# Altium schematic symbol library jlcpcb_2025_04_capacitors_extended_0805.schlib: 3281 symbols (part 17 of 18) (continued)
## TCC0805COG181J101BT
designator C?  Capacitance: 180pF  (hidden comment: *)
Capacitor, Ceramic (MLCC), 180pF, ±5%, 100V, null, ±5%, SMD 0805; Manufacturer: CCTC; Manufacturer Part Number: TCC0805COG181J101BT; Package Size: 0805; JLCPCB Basic Part: No; JLCPCB Part Number: C7393915; Supplier 1: LCSC; Category: Capacitors - MLCC; Supplier Part Number 1: C7393915; Tolerance: ±5%; Voltage Rating: 100V; Temperature Coefficient: null; RoHS: Yes; ComponentLink1Description: Datasheet; ComponentLink1URL: https://wmsc.lcsc.com/wmsc/upload/file/pdf/v2/lcsc/2306211554_CCTC-TCC0805COG181J101BT_C7393915.pdf; ComponentLink2Description: JLCPCB Part URL; ComponentLink2URL: https://jlcpcb.com/partdetail/C7393915; ComponentLink3Description: LCSC Part URL; ComponentLink3URL: https://lcsc.com/product-detail/Multilayer-Ceramic-Capacitors-MLCC---SMD-SMT_CCTC-CCTC-TCC0805COG181J101BT_C7393915.html
footprint CAP-0805 (0805 (2012M) Capacitor)
pins: 1, 2

## TCC0805COG181J500BT
designator C?  Capacitance: 180pF  (hidden comment: *)
Capacitor, Ceramic (MLCC), 180pF, ±5%, 50V, C0G, ±5%, SMD 0805; Manufacturer: CCTC; Manufacturer Part Number: TCC0805COG181J500BT; Package Size: 0805; JLCPCB Basic Part: No; JLCPCB Part Number: C376868; Supplier 1: LCSC; Category: Capacitors - MLCC; Supplier Part Number 1: C376868; Tolerance: ±5%; Voltage Rating: 50V; Temperature Coefficient: C0G; RoHS: Yes; ComponentLink1Description: Datasheet; ComponentLink1URL: https://wmsc.lcsc.com/wmsc/upload/file/pdf/v2/lcsc/2304140030_CCTC-TCC0805COG181J500BT_C376868.pdf; ComponentLink2Description: JLCPCB Part URL; ComponentLink2URL: https://jlcpcb.com/partdetail/C376868; ComponentLink3Description: LCSC Part URL; ComponentLink3URL: https://lcsc.com/product-detail/Multilayer-Ceramic-Capacitors-MLCC---SMD-SMT_CCTC-CCTC-TCC0805COG181J500BT_C376868.html
footprint CAP-0805 (0805 (2012M) Capacitor)
pins: 1, 2

## TCC0805COG200J101BT
designator C?  Capacitance: 20pF  (hidden comment: *)
Capacitor, Ceramic (MLCC), 20pF, ±5%, 100V, C0G, ±5%, SMD 0805; Manufacturer: CCTC; Manufacturer Part Number: TCC0805COG200J101BT; Package Size: 0805; JLCPCB Basic Part: No; JLCPCB Part Number: C696908; Supplier 1: LCSC; Category: Capacitors - MLCC; Supplier Part Number 1: C696908; Tolerance: ±5%; Voltage Rating: 100V; Temperature Coefficient: C0G; RoHS: Yes; ComponentLink1Description: Datasheet; ComponentLink1URL: https://wmsc.lcsc.com/wmsc/upload/file/pdf/v2/lcsc/2304140030_CCTC-TCC0805COG200J101BT_C696908.pdf; ComponentLink2Description: JLCPCB Part URL; ComponentLink2URL: https://jlcpcb.com/partdetail/C696908; ComponentLink3Description: LCSC Part URL; ComponentLink3URL: https://lcsc.com/product-detail/Multilayer-Ceramic-Capacitors-MLCC---SMD-SMT_CCTC-CCTC-TCC0805COG200J101BT_C696908.html
footprint CAP-0805 (0805 (2012M) Capacitor)
pins: 1, 2

## TCC0805COG200J500BT
designator C?  Capacitance: 20pF  (hidden comment: *)
Capacitor, Ceramic (MLCC), 20pF, ±5%, 50V, C0G, ±5%, SMD 0805; Manufacturer: CCTC; Manufacturer Part Number: TCC0805COG200J500BT; Package Size: 0805; JLCPCB Basic Part: No; JLCPCB Part Number: C309037; Supplier 1: LCSC; Category: Capacitors - MLCC; Supplier Part Number 1: C309037; Tolerance: ±5%; Voltage Rating: 50V; Temperature Coefficient: C0G; RoHS: Yes; ComponentLink1Description: Datasheet; ComponentLink1URL: https://wmsc.lcsc.com/wmsc/upload/file/pdf/v2/lcsc/2304140030_CCTC-TCC0805COG200J500BT_C309037.pdf; ComponentLink2Description: JLCPCB Part URL; ComponentLink2URL: https://jlcpcb.com/partdetail/C309037; ComponentLink3Description: LCSC Part URL; ComponentLink3URL: https://lcsc.com/product-detail/Multilayer-Ceramic-Capacitors-MLCC---SMD-SMT_CCTC-CCTC-TCC0805COG200J500BT_C309037.html
footprint CAP-0805 (0805 (2012M) Capacitor)
pins: 1, 2

## TCC0805COG200K500BT
designator C?  Capacitance: 20pF  (hidden comment: *)
Capacitor, Ceramic (MLCC), 20pF, ±10%, null, null, ±10%, SMD 0805; Manufacturer: CCTC; Manufacturer Part Number: TCC0805COG200K500BT; Package Size: 0805; JLCPCB Basic Part: No; JLCPCB Part Number: C5375851; Supplier 1: LCSC; Category: Capacitors - MLCC; Supplier Part Number 1: C5375851; Tolerance: ±10%; Voltage Rating: null; Temperature Coefficient: null; RoHS: Yes; ComponentLink1Description: Datasheet; ComponentLink2Description: JLCPCB Part URL; ComponentLink2URL: https://jlcpcb.com/partdetail/C5375851; ComponentLink3Description: LCSC Part URL; ComponentLink3URL: https://lcsc.com/product-detail/Multilayer-Ceramic-Capacitors-MLCC---SMD-SMT_CCTC-CCTC-TCC0805COG200K500BT_C5375851.html
footprint CAP-0805 (0805 (2012M) Capacitor)
pins: 1, 2

## TCC0805COG201J251BT
designator C?  Capacitance: 200pF  (hidden comment: *)
Capacitor, Ceramic (MLCC), 200pF, ±5%, 250V, null, ±5%, SMD 0805; Manufacturer: CCTC; Manufacturer Part Number: TCC0805COG201J251BT; Package Size: 0805; JLCPCB Basic Part: No; JLCPCB Part Number: C7393917; Supplier 1: LCSC; Category: Capacitors - MLCC; Supplier Part Number 1: C7393917; Tolerance: ±5%; Voltage Rating: 250V; Temperature Coefficient: null; RoHS: Yes; ComponentLink1Description: Datasheet; ComponentLink1URL: https://wmsc.lcsc.com/wmsc/upload/file/pdf/v2/lcsc/2306211554_CCTC-TCC0805COG201J251BT_C7393917.pdf; ComponentLink2Description: JLCPCB Part URL; ComponentLink2URL: https://jlcpcb.com/partdetail/C7393917; ComponentLink3Description: LCSC Part URL; ComponentLink3URL: https://lcsc.com/product-detail/Multilayer-Ceramic-Capacitors-MLCC---SMD-SMT_CCTC-CCTC-TCC0805COG201J251BT_C7393917.html
footprint CAP-0805 (0805 (2012M) Capacitor)
pins: 1, 2

## TCC0805COG201J500BT
designator C?  Capacitance: 200pF  (hidden comment: *)
Capacitor, Ceramic (MLCC), 200pF, ±5%, 50V, C0G, ±5%, SMD 0805; Manufacturer: CCTC; Manufacturer Part Number: TCC0805COG201J500BT; Package Size: 0805; JLCPCB Basic Part: No; JLCPCB Part Number: C376871; Supplier 1: LCSC; Category: Capacitors - MLCC; Supplier Part Number 1: C376871; Tolerance: ±5%; Voltage Rating: 50V; Temperature Coefficient: C0G; RoHS: Yes; ComponentLink1Description: Datasheet; ComponentLink1URL: https://wmsc.lcsc.com/wmsc/upload/file/pdf/v2/lcsc/2304140030_CCTC-TCC0805COG201J500BT_C376871.pdf; ComponentLink2Description: JLCPCB Part URL; ComponentLink2URL: https://jlcpcb.com/partdetail/C376871; ComponentLink3Description: LCSC Part URL; ComponentLink3URL: https://lcsc.com/product-detail/Multilayer-Ceramic-Capacitors-MLCC---SMD-SMT_CCTC-CCTC-TCC0805COG201J500BT_C376871.html
footprint CAP-0805 (0805 (2012M) Capacitor)
pins: 1, 2

## TCC0805COG220J101BT
designator C?  Capacitance: 22pF  (hidden comment: *)
Capacitor, Ceramic (MLCC), 22pF, ±5%, 100V, C0G, ±5%, SMD 0805; Manufacturer: CCTC; Manufacturer Part Number: TCC0805COG220J101BT; Package Size: 0805; JLCPCB Basic Part: No; JLCPCB Part Number: C376872; Supplier 1: LCSC; Category: Capacitors - MLCC; Supplier Part Number 1: C376872; Tolerance: ±5%; Voltage Rating: 100V; Temperature Coefficient: C0G; RoHS: Yes; ComponentLink1Description: Datasheet; ComponentLink1URL: https://wmsc.lcsc.com/wmsc/upload/file/pdf/v2/lcsc/2304140030_CCTC-TCC0805COG220J101BT_C376872.pdf; ComponentLink2Description: JLCPCB Part URL; ComponentLink2URL: https://jlcpcb.com/partdetail/C376872; ComponentLink3Description: LCSC Part URL; ComponentLink3URL: https://lcsc.com/product-detail/Multilayer-Ceramic-Capacitors-MLCC---SMD-SMT_CCTC-CCTC-TCC0805COG220J101BT_C376872.html
footprint CAP-0805 (0805 (2012M) Capacitor)
pins: 1, 2

## TCC0805COG220J251BT
designator C?  Capacitance: 22pF  (hidden comment: *)
Capacitor, Ceramic (MLCC), 22pF, ±5%, 250V, C0G, ±5%, SMD 0805; Manufacturer: CCTC; Manufacturer Part Number: TCC0805COG220J251BT; Package Size: 0805; JLCPCB Basic Part: No; JLCPCB Part Number: C696909; Supplier 1: LCSC; Category: Capacitors - MLCC; Supplier Part Number 1: C696909; Tolerance: ±5%; Voltage Rating: 250V; Temperature Coefficient: C0G; RoHS: Yes; ComponentLink1Description: Datasheet; ComponentLink1URL: https://wmsc.lcsc.com/wmsc/upload/file/pdf/v2/lcsc/2304140030_CCTC-TCC0805COG220J251BT_C696909.pdf; ComponentLink2Description: JLCPCB Part URL; ComponentLink2URL: https://jlcpcb.com/partdetail/C696909; ComponentLink3Description: LCSC Part URL; ComponentLink3URL: https://lcsc.com/product-detail/Multilayer-Ceramic-Capacitors-MLCC---SMD-SMT_CCTC-CCTC-TCC0805COG220J251BT_C696909.html
footprint CAP-0805 (0805 (2012M) Capacitor)
pins: 1, 2

## TCC0805COG220J500BT
designator C?  Capacitance: 22pF  (hidden comment: *)
Capacitor, Ceramic (MLCC), 22pF, ±5%, 50V, C0G, ±5%, SMD 0805; Manufacturer: CCTC; Manufacturer Part Number: TCC0805COG220J500BT; Package Size: 0805; JLCPCB Basic Part: No; JLCPCB Part Number: C376875; Supplier 1: LCSC; Category: Capacitors - MLCC; Supplier Part Number 1: C376875; Tolerance: ±5%; Voltage Rating: 50V; Temperature Coefficient: C0G; RoHS: Yes; ComponentLink1Description: Datasheet; ComponentLink1URL: https://wmsc.lcsc.com/wmsc/upload/file/pdf/v2/lcsc/2304140030_CCTC-TCC0805COG220J500BT_C376875.pdf; ComponentLink2Description: JLCPCB Part URL; ComponentLink2URL: https://jlcpcb.com/partdetail/C376875; ComponentLink3Description: LCSC Part URL; ComponentLink3URL: https://lcsc.com/product-detail/Multilayer-Ceramic-Capacitors-MLCC---SMD-SMT_CCTC-CCTC-TCC0805COG220J500BT_C376875.html
footprint CAP-0805 (0805 (2012M) Capacitor)
pins: 1, 2

## TCC0805COG221J500BT
designator C?  Capacitance: 220pF  (hidden comment: *)
Capacitor, Ceramic (MLCC), 220pF, ±5%, 50V, C0G, ±5%, SMD 0805; Manufacturer: CCTC; Manufacturer Part Number: TCC0805COG221J500BT; Package Size: 0805; JLCPCB Basic Part: No; JLCPCB Part Number: C309035; Supplier 1: LCSC; Category: Capacitors - MLCC; Supplier Part Number 1: C309035; Tolerance: ±5%; Voltage Rating: 50V; Temperature Coefficient: C0G; RoHS: Yes; ComponentLink1Description: Datasheet; ComponentLink1URL: https://wmsc.lcsc.com/wmsc/upload/file/pdf/v2/lcsc/2304140030_CCTC-TCC0805COG221J500BT_C309035.pdf; ComponentLink2Description: JLCPCB Part URL; ComponentLink2URL: https://jlcpcb.com/partdetail/C309035; ComponentLink3Description: LCSC Part URL; ComponentLink3URL: https://lcsc.com/product-detail/Multilayer-Ceramic-Capacitors-MLCC---SMD-SMT_CCTC-CCTC-TCC0805COG221J500BT_C309035.html
footprint CAP-0805 (0805 (2012M) Capacitor)
pins: 1, 2

## TCC0805COG222J500BT
designator C?  Capacitance: 2.2nF  (hidden comment: *)
Capacitor, Ceramic (MLCC), 2.2nF, ±5%, 50V, C0G, ±5%, SMD 0805; Manufacturer: CCTC; Manufacturer Part Number: TCC0805COG222J500BT; Package Size: 0805; JLCPCB Basic Part: No; JLCPCB Part Number: C380330; Supplier 1: LCSC; Category: Capacitors - MLCC; Supplier Part Number 1: C380330; Tolerance: ±5%; Voltage Rating: 50V; Temperature Coefficient: C0G; RoHS: Yes; ComponentLink1Description: Datasheet; ComponentLink1URL: https://wmsc.lcsc.com/wmsc/upload/file/pdf/v2/lcsc/2304140030_CCTC-TCC0805COG222J500BT_C380330.pdf; ComponentLink2Description: JLCPCB Part URL; ComponentLink2URL: https://jlcpcb.com/partdetail/C380330; ComponentLink3Description: LCSC Part URL; ComponentLink3URL: https://lcsc.com/product-detail/Multilayer-Ceramic-Capacitors-MLCC---SMD-SMT_CCTC-CCTC-TCC0805COG222J500BT_C380330.html
footprint CAP-0805 (0805 (2012M) Capacitor)
pins: 1, 2

## TCC0805COG240J500BT
designator C?  Capacitance: 24pF  (hidden comment: *)
Capacitor, Ceramic (MLCC), 24pF, ±5%, 50V, C0G, ±5%, SMD 0805; Manufacturer: CCTC; Manufacturer Part Number: TCC0805COG240J500BT; Package Size: 0805; JLCPCB Basic Part: No; JLCPCB Part Number: C376877; Supplier 1: LCSC; Category: Capacitors - MLCC; Supplier Part Number 1: C376877; Tolerance: ±5%; Voltage Rating: 50V; Temperature Coefficient: C0G; RoHS: Yes; ComponentLink1Description: Datasheet; ComponentLink1URL: https://wmsc.lcsc.com/wmsc/upload/file/pdf/v2/lcsc/2304140030_CCTC-TCC0805COG240J500BT_C376877.pdf; ComponentLink2Description: JLCPCB Part URL; ComponentLink2URL: https://jlcpcb.com/partdetail/C376877; ComponentLink3Description: LCSC Part URL; ComponentLink3URL: https://lcsc.com/product-detail/Multilayer-Ceramic-Capacitors-MLCC---SMD-SMT_CCTC-CCTC-TCC0805COG240J500BT_C376877.html
footprint CAP-0805 (0805 (2012M) Capacitor)
pins: 1, 2

## TCC0805COG250J500BT
designator C?  Capacitance: 25pF  (hidden comment: *)
Capacitor, Ceramic (MLCC), 25pF, ±5%, 50V, C0G, ±5%, SMD 0805; Manufacturer: CCTC; Manufacturer Part Number: TCC0805COG250J500BT; Package Size: 0805; JLCPCB Basic Part: No; JLCPCB Part Number: C376878; Supplier 1: LCSC; Category: Capacitors - MLCC; Supplier Part Number 1: C376878; Tolerance: ±5%; Voltage Rating: 50V; Temperature Coefficient: C0G; RoHS: Yes; ComponentLink1Description: Datasheet; ComponentLink1URL: https://wmsc.lcsc.com/wmsc/upload/file/pdf/v2/lcsc/2304140030_CCTC-TCC0805COG250J500BT_C376878.pdf; ComponentLink2Description: JLCPCB Part URL; ComponentLink2URL: https://jlcpcb.com/partdetail/C376878; ComponentLink3Description: LCSC Part URL; ComponentLink3URL: https://lcsc.com/product-detail/Multilayer-Ceramic-Capacitors-MLCC---SMD-SMT_CCTC-CCTC-TCC0805COG250J500BT_C376878.html
footprint CAP-0805 (0805 (2012M) Capacitor)
pins: 1, 2

## TCC0805COG270J500BT
designator C?  Capacitance: 27pF  (hidden comment: *)
Capacitor, Ceramic (MLCC), 27pF, ±5%, 50V, C0G, ±5%, SMD 0805; Manufacturer: CCTC; Manufacturer Part Number: TCC0805COG270J500BT; Package Size: 0805; JLCPCB Basic Part: No; JLCPCB Part Number: C282694; Supplier 1: LCSC; Category: Capacitors - MLCC; Supplier Part Number 1: C282694; Tolerance: ±5%; Voltage Rating: 50V; Temperature Coefficient: C0G; RoHS: Yes; ComponentLink1Description: Datasheet; ComponentLink1URL: https://wmsc.lcsc.com/wmsc/upload/file/pdf/v2/lcsc/2304140030_CCTC-TCC0805COG270J500BT_C282694.pdf; ComponentLink2Description: JLCPCB Part URL; ComponentLink2URL: https://jlcpcb.com/partdetail/C282694; ComponentLink3Description: LCSC Part URL; ComponentLink3URL: https://lcsc.com/product-detail/Multilayer-Ceramic-Capacitors-MLCC---SMD-SMT_CCTC-CCTC-TCC0805COG270J500BT_C282694.html
footprint CAP-0805 (0805 (2012M) Capacitor)
pins: 1, 2

## TCC0805COG300J500BT
designator C?  Capacitance: 30pF  (hidden comment: *)
Capacitor, Ceramic (MLCC), 30pF, ±5%, 50V, C0G, ±5%, SMD 0805; Manufacturer: CCTC; Manufacturer Part Number: TCC0805COG300J500BT; Package Size: 0805; JLCPCB Basic Part: No; JLCPCB Part Number: C376880; Supplier 1: LCSC; Category: Capacitors - MLCC; Supplier Part Number 1: C376880; Tolerance: ±5%; Voltage Rating: 50V; Temperature Coefficient: C0G; RoHS: Yes; ComponentLink1Description: Datasheet; ComponentLink1URL: https://wmsc.lcsc.com/wmsc/upload/file/pdf/v2/lcsc/2304140030_CCTC-TCC0805COG300J500BT_C376880.pdf; ComponentLink2Description: JLCPCB Part URL; ComponentLink2URL: https://jlcpcb.com/partdetail/C376880; ComponentLink3Description: LCSC Part URL; ComponentLink3URL: https://lcsc.com/product-detail/Multilayer-Ceramic-Capacitors-MLCC---SMD-SMT_CCTC-CCTC-TCC0805COG300J500BT_C376880.html
footprint CAP-0805 (0805 (2012M) Capacitor)
pins: 1, 2

## TCC0805COG301J500BT
designator C?  Capacitance: 300pF  (hidden comment: *)
Capacitor, Ceramic (MLCC), 300pF, ±5%, 50V, C0G, ±5%, SMD 0805; Manufacturer: CCTC; Manufacturer Part Number: TCC0805COG301J500BT; Package Size: 0805; JLCPCB Basic Part: No; JLCPCB Part Number: C282698; Supplier 1: LCSC; Category: Capacitors - MLCC; Supplier Part Number 1: C282698; Tolerance: ±5%; Voltage Rating: 50V; Temperature Coefficient: C0G; RoHS: Yes; ComponentLink1Description: Datasheet; ComponentLink1URL: https://wmsc.lcsc.com/wmsc/upload/file/pdf/v2/lcsc/2304140030_CCTC-TCC0805COG301J500BT_C282698.pdf; ComponentLink2Description: JLCPCB Part URL; ComponentLink2URL: https://jlcpcb.com/partdetail/C282698; ComponentLink3Description: LCSC Part URL; ComponentLink3URL: https://lcsc.com/product-detail/Multilayer-Ceramic-Capacitors-MLCC---SMD-SMT_CCTC-CCTC-TCC0805COG301J500BT_C282698.html
footprint CAP-0805 (0805 (2012M) Capacitor)
pins: 1, 2

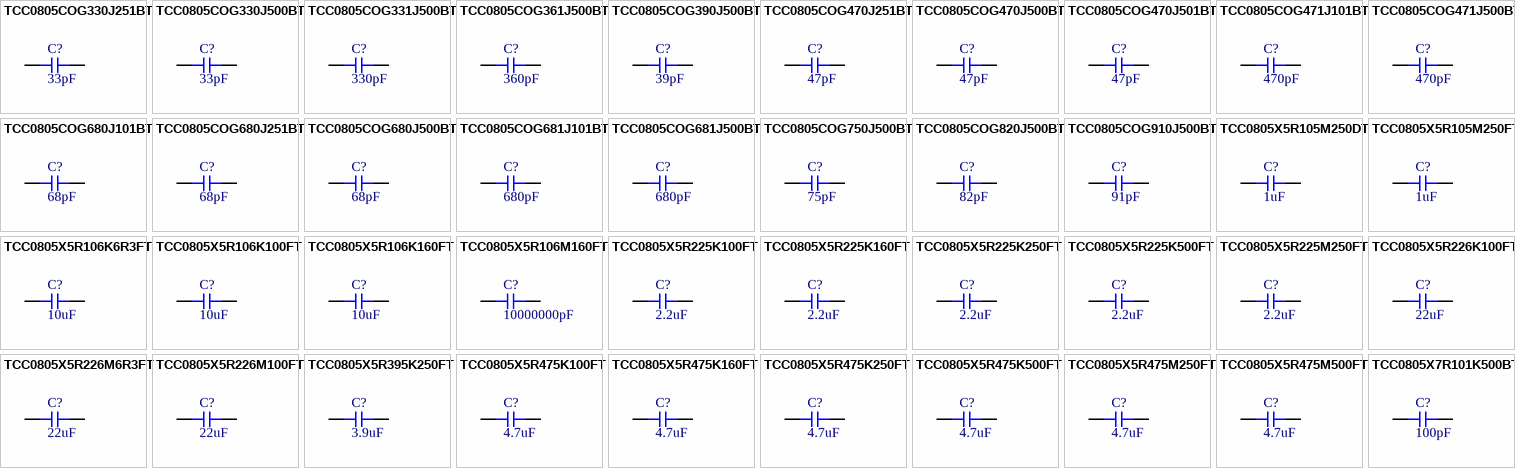
[diagram p75: symbols TCC0805COG330J251BT to TCC0805X7R101K500BT]

## TCC0805COG330J251BT
designator C?  Capacitance: 33pF  (hidden comment: *)
Capacitor, Ceramic (MLCC), 33pF, ±5%, 250V, C0G, ±5%, SMD 0805; Manufacturer: CCTC; Manufacturer Part Number: TCC0805COG330J251BT; Package Size: 0805; JLCPCB Basic Part: No; JLCPCB Part Number: C282699; Supplier 1: LCSC; Category: Capacitors - MLCC; Supplier Part Number 1: C282699; Tolerance: ±5%; Voltage Rating: 250V; Temperature Coefficient: C0G; RoHS: Yes; ComponentLink1Description: Datasheet; ComponentLink1URL: https://wmsc.lcsc.com/wmsc/upload/file/pdf/v2/lcsc/2304140030_CCTC-TCC0805COG330J251BT_C282699.pdf; ComponentLink2Description: JLCPCB Part URL; ComponentLink2URL: https://jlcpcb.com/partdetail/C282699; ComponentLink3Description: LCSC Part URL; ComponentLink3URL: https://lcsc.com/product-detail/Multilayer-Ceramic-Capacitors-MLCC---SMD-SMT_CCTC-CCTC-TCC0805COG330J251BT_C282699.html
footprint CAP-0805 (0805 (2012M) Capacitor)
pins: 1, 2

## TCC0805COG330J500BT
designator C?  Capacitance: 33pF  (hidden comment: *)
Capacitor, Ceramic (MLCC), 33pF, ±5%, 50V, C0G, ±5%, SMD 0805; Manufacturer: CCTC; Manufacturer Part Number: TCC0805COG330J500BT; Package Size: 0805; JLCPCB Basic Part: No; JLCPCB Part Number: C309034; Supplier 1: LCSC; Category: Capacitors - MLCC; Supplier Part Number 1: C309034; Tolerance: ±5%; Voltage Rating: 50V; Temperature Coefficient: C0G; RoHS: Yes; ComponentLink1Description: Datasheet; ComponentLink1URL: https://wmsc.lcsc.com/wmsc/upload/file/pdf/v2/lcsc/2304140030_CCTC-TCC0805COG330J500BT_C309034.pdf; ComponentLink2Description: JLCPCB Part URL; ComponentLink2URL: https://jlcpcb.com/partdetail/C309034; ComponentLink3Description: LCSC Part URL; ComponentLink3URL: https://lcsc.com/product-detail/Multilayer-Ceramic-Capacitors-MLCC---SMD-SMT_CCTC-CCTC-TCC0805COG330J500BT_C309034.html
footprint CAP-0805 (0805 (2012M) Capacitor)
pins: 1, 2

## TCC0805COG331J500BT
designator C?  Capacitance: 330pF  (hidden comment: *)
Capacitor, Ceramic (MLCC), 330pF, ±5%, 50V, C0G, ±5%, SMD 0805; Manufacturer: CCTC; Manufacturer Part Number: TCC0805COG331J500BT; Package Size: 0805; JLCPCB Basic Part: No; JLCPCB Part Number: C282701; Supplier 1: LCSC; Category: Capacitors - MLCC; Supplier Part Number 1: C282701; Tolerance: ±5%; Voltage Rating: 50V; Temperature Coefficient: C0G; RoHS: Yes; ComponentLink1Description: Datasheet; ComponentLink1URL: https://wmsc.lcsc.com/wmsc/upload/file/pdf/v2/lcsc/2304140030_CCTC-TCC0805COG331J500BT_C282701.pdf; ComponentLink2Description: JLCPCB Part URL; ComponentLink2URL: https://jlcpcb.com/partdetail/C282701; ComponentLink3Description: LCSC Part URL; ComponentLink3URL: https://lcsc.com/product-detail/Multilayer-Ceramic-Capacitors-MLCC---SMD-SMT_CCTC-CCTC-TCC0805COG331J500BT_C282701.html
footprint CAP-0805 (0805 (2012M) Capacitor)
pins: 1, 2

## TCC0805COG361J500BT
designator C?  Capacitance: 360pF  (hidden comment: *)
Capacitor, Ceramic (MLCC), 360pF, ±5%, null, C0G, ±5%, SMD 0805; Manufacturer: CCTC; Manufacturer Part Number: TCC0805COG361J500BT; Package Size: 0805; JLCPCB Basic Part: No; JLCPCB Part Number: C5375895; Supplier 1: LCSC; Category: Capacitors - MLCC; Supplier Part Number 1: C5375895; Tolerance: ±5%; Voltage Rating: null; Temperature Coefficient: C0G; RoHS: Yes; ComponentLink1Description: Datasheet; ComponentLink1URL: https://wmsc.lcsc.com/wmsc/upload/file/pdf/v2/lcsc/2403281710_CCTC-TCC0805COG361J500BT_C5375895.pdf; ComponentLink2Description: JLCPCB Part URL; ComponentLink2URL: https://jlcpcb.com/partdetail/C5375895; ComponentLink3Description: LCSC Part URL; ComponentLink3URL: https://lcsc.com/product-detail/Multilayer-Ceramic-Capacitors-MLCC---SMD-SMT_CCTC-CCTC-TCC0805COG361J500BT_C5375895.html
footprint CAP-0805 (0805 (2012M) Capacitor)
pins: 1, 2

## TCC0805COG390J500BT
designator C?  Capacitance: 39pF  (hidden comment: *)
Capacitor, Ceramic (MLCC), 39pF, ±5%, 50V, C0G, ±5%, SMD 0805; Manufacturer: CCTC; Manufacturer Part Number: TCC0805COG390J500BT; Package Size: 0805; JLCPCB Basic Part: No; JLCPCB Part Number: C282702; Supplier 1: LCSC; Category: Capacitors - MLCC; Supplier Part Number 1: C282702; Tolerance: ±5%; Voltage Rating: 50V; Temperature Coefficient: C0G; RoHS: Yes; ComponentLink1Description: Datasheet; ComponentLink1URL: https://wmsc.lcsc.com/wmsc/upload/file/pdf/v2/lcsc/2304140030_CCTC-TCC0805COG390J500BT_C282702.pdf; ComponentLink2Description: JLCPCB Part URL; ComponentLink2URL: https://jlcpcb.com/partdetail/C282702; ComponentLink3Description: LCSC Part URL; ComponentLink3URL: https://lcsc.com/product-detail/Multilayer-Ceramic-Capacitors-MLCC---SMD-SMT_CCTC-CCTC-TCC0805COG390J500BT_C282702.html
footprint CAP-0805 (0805 (2012M) Capacitor)
pins: 1, 2

## TCC0805COG470J251BT
designator C?  Capacitance: 47pF  (hidden comment: *)
Capacitor, Ceramic (MLCC), 47pF, ±5%, 250V, C0G, ±5%, SMD 0805; Manufacturer: CCTC; Manufacturer Part Number: TCC0805COG470J251BT; Package Size: 0805; JLCPCB Basic Part: No; JLCPCB Part Number: C376891; Supplier 1: LCSC; Category: Capacitors - MLCC; Supplier Part Number 1: C376891; Tolerance: ±5%; Voltage Rating: 250V; Temperature Coefficient: C0G; RoHS: Yes; ComponentLink1Description: Datasheet; ComponentLink1URL: https://wmsc.lcsc.com/wmsc/upload/file/pdf/v2/lcsc/2304140030_CCTC-TCC0805COG470J251BT_C376891.pdf; ComponentLink2Description: JLCPCB Part URL; ComponentLink2URL: https://jlcpcb.com/partdetail/C376891; ComponentLink3Description: LCSC Part URL; ComponentLink3URL: https://lcsc.com/product-detail/Multilayer-Ceramic-Capacitors-MLCC---SMD-SMT_CCTC-CCTC-TCC0805COG470J251BT_C376891.html
footprint CAP-0805 (0805 (2012M) Capacitor)
pins: 1, 2

## TCC0805COG470J500BT
designator C?  Capacitance: 47pF  (hidden comment: *)
Capacitor, Ceramic (MLCC), 47pF, ±5%, 50V, C0G, ±5%, SMD 0805; Manufacturer: CCTC; Manufacturer Part Number: TCC0805COG470J500BT; Package Size: 0805; JLCPCB Basic Part: No; JLCPCB Part Number: C376893; Supplier 1: LCSC; Category: Capacitors - MLCC; Supplier Part Number 1: C376893; Tolerance: ±5%; Voltage Rating: 50V; Temperature Coefficient: C0G; RoHS: Yes; ComponentLink1Description: Datasheet; ComponentLink1URL: https://wmsc.lcsc.com/wmsc/upload/file/pdf/v2/lcsc/2304140030_CCTC-TCC0805COG470J500BT_C376893.pdf; ComponentLink2Description: JLCPCB Part URL; ComponentLink2URL: https://jlcpcb.com/partdetail/C376893; ComponentLink3Description: LCSC Part URL; ComponentLink3URL: https://lcsc.com/product-detail/Multilayer-Ceramic-Capacitors-MLCC---SMD-SMT_CCTC-CCTC-TCC0805COG470J500BT_C376893.html
footprint CAP-0805 (0805 (2012M) Capacitor)
pins: 1, 2

## TCC0805COG470J501BT
designator C?  Capacitance: 47pF  (hidden comment: *)
Capacitor, Ceramic (MLCC), 47pF, ±5%, 500V, C0G, ±5%, SMD 0805; Manufacturer: CCTC; Manufacturer Part Number: TCC0805COG470J501BT; Package Size: 0805; JLCPCB Basic Part: No; JLCPCB Part Number: C376894; Supplier 1: LCSC; Category: Capacitors - MLCC; Supplier Part Number 1: C376894; Tolerance: ±5%; Voltage Rating: 500V; Temperature Coefficient: C0G; RoHS: Yes; ComponentLink1Description: Datasheet; ComponentLink1URL: https://wmsc.lcsc.com/wmsc/upload/file/pdf/v2/lcsc/2304140030_CCTC-TCC0805COG470J501BT_C376894.pdf; ComponentLink2Description: JLCPCB Part URL; ComponentLink2URL: https://jlcpcb.com/partdetail/C376894; ComponentLink3Description: LCSC Part URL; ComponentLink3URL: https://lcsc.com/product-detail/Multilayer-Ceramic-Capacitors-MLCC---SMD-SMT_CCTC-CCTC-TCC0805COG470J501BT_C376894.html
footprint CAP-0805 (0805 (2012M) Capacitor)
pins: 1, 2

## TCC0805COG471J101BT
designator C?  Capacitance: 470pF  (hidden comment: *)
Capacitor, Ceramic (MLCC), 470pF, ±5%, 100V, C0G, ±5%, SMD 0805; Manufacturer: CCTC; Manufacturer Part Number: TCC0805COG471J101BT; Package Size: 0805; JLCPCB Basic Part: No; JLCPCB Part Number: C376896; Supplier 1: LCSC; Category: Capacitors - MLCC; Supplier Part Number 1: C376896; Tolerance: ±5%; Voltage Rating: 100V; Temperature Coefficient: C0G; RoHS: Yes; ComponentLink1Description: Datasheet; ComponentLink1URL: https://wmsc.lcsc.com/wmsc/upload/file/pdf/v2/lcsc/2304140030_CCTC-TCC0805COG471J101BT_C376896.pdf; ComponentLink2Description: JLCPCB Part URL; ComponentLink2URL: https://jlcpcb.com/partdetail/C376896; ComponentLink3Description: LCSC Part URL; ComponentLink3URL: https://lcsc.com/product-detail/Multilayer-Ceramic-Capacitors-MLCC---SMD-SMT_CCTC-CCTC-TCC0805COG471J101BT_C376896.html
footprint CAP-0805 (0805 (2012M) Capacitor)
pins: 1, 2

## TCC0805COG471J500BT
designator C?  Capacitance: 470pF  (hidden comment: *)
Capacitor, Ceramic (MLCC), 470pF, ±5%, 50V, C0G, ±5%, SMD 0805; Manufacturer: CCTC; Manufacturer Part Number: TCC0805COG471J500BT; Package Size: 0805; JLCPCB Basic Part: No; JLCPCB Part Number: C282703; Supplier 1: LCSC; Category: Capacitors - MLCC; Supplier Part Number 1: C282703; Tolerance: ±5%; Voltage Rating: 50V; Temperature Coefficient: C0G; RoHS: Yes; ComponentLink1Description: Datasheet; ComponentLink1URL: https://wmsc.lcsc.com/wmsc/upload/file/pdf/v2/lcsc/2304140030_CCTC-TCC0805COG471J500BT_C282703.pdf; ComponentLink2Description: JLCPCB Part URL; ComponentLink2URL: https://jlcpcb.com/partdetail/C282703; ComponentLink3Description: LCSC Part URL; ComponentLink3URL: https://lcsc.com/product-detail/Multilayer-Ceramic-Capacitors-MLCC---SMD-SMT_CCTC-CCTC-TCC0805COG471J500BT_C282703.html
footprint CAP-0805 (0805 (2012M) Capacitor)
pins: 1, 2

## TCC0805COG680J101BT
designator C?  Capacitance: 68pF  (hidden comment: *)
Capacitor, Ceramic (MLCC), 68pF, ±5%, 100V, C0G, ±5%, SMD 0805; Manufacturer: CCTC; Manufacturer Part Number: TCC0805COG680J101BT; Package Size: 0805; JLCPCB Basic Part: No; JLCPCB Part Number: C376904; Supplier 1: LCSC; Category: Capacitors - MLCC; Supplier Part Number 1: C376904; Tolerance: ±5%; Voltage Rating: 100V; Temperature Coefficient: C0G; RoHS: Yes; ComponentLink1Description: Datasheet; ComponentLink1URL: https://wmsc.lcsc.com/wmsc/upload/file/pdf/v2/lcsc/2304140030_CCTC-TCC0805COG680J101BT_C376904.pdf; ComponentLink2Description: JLCPCB Part URL; ComponentLink2URL: https://jlcpcb.com/partdetail/C376904; ComponentLink3Description: LCSC Part URL; ComponentLink3URL: https://lcsc.com/product-detail/Multilayer-Ceramic-Capacitors-MLCC---SMD-SMT_CCTC-CCTC-TCC0805COG680J101BT_C376904.html
footprint CAP-0805 (0805 (2012M) Capacitor)
pins: 1, 2

## TCC0805COG680J251BT
designator C?  Capacitance: 68pF  (hidden comment: *)
Capacitor, Ceramic (MLCC), 68pF, ±5%, 250V, C0G, ±5%, SMD 0805; Manufacturer: CCTC; Manufacturer Part Number: TCC0805COG680J251BT; Package Size: 0805; JLCPCB Basic Part: No; JLCPCB Part Number: C282707; Supplier 1: LCSC; Category: Capacitors - MLCC; Supplier Part Number 1: C282707; Tolerance: ±5%; Voltage Rating: 250V; Temperature Coefficient: C0G; RoHS: Yes; ComponentLink1Description: Datasheet; ComponentLink1URL: https://wmsc.lcsc.com/wmsc/upload/file/pdf/v2/lcsc/2304140030_CCTC-TCC0805COG680J251BT_C282707.pdf; ComponentLink2Description: JLCPCB Part URL; ComponentLink2URL: https://jlcpcb.com/partdetail/C282707; ComponentLink3Description: LCSC Part URL; ComponentLink3URL: https://lcsc.com/product-detail/Multilayer-Ceramic-Capacitors-MLCC---SMD-SMT_CCTC-CCTC-TCC0805COG680J251BT_C282707.html
footprint CAP-0805 (0805 (2012M) Capacitor)
pins: 1, 2

## TCC0805COG680J500BT
designator C?  Capacitance: 68pF  (hidden comment: *)
Capacitor, Ceramic (MLCC), 68pF, ±5%, 50V, C0G, ±5%, SMD 0805; Manufacturer: CCTC; Manufacturer Part Number: TCC0805COG680J500BT; Package Size: 0805; JLCPCB Basic Part: No; JLCPCB Part Number: C376905; Supplier 1: LCSC; Category: Capacitors - MLCC; Supplier Part Number 1: C376905; Tolerance: ±5%; Voltage Rating: 50V; Temperature Coefficient: C0G; RoHS: Yes; ComponentLink1Description: Datasheet; ComponentLink1URL: https://wmsc.lcsc.com/wmsc/upload/file/pdf/v2/lcsc/2304140030_CCTC-TCC0805COG680J500BT_C376905.pdf; ComponentLink2Description: JLCPCB Part URL; ComponentLink2URL: https://jlcpcb.com/partdetail/C376905; ComponentLink3Description: LCSC Part URL; ComponentLink3URL: https://lcsc.com/product-detail/Multilayer-Ceramic-Capacitors-MLCC---SMD-SMT_CCTC-CCTC-TCC0805COG680J500BT_C376905.html
footprint CAP-0805 (0805 (2012M) Capacitor)
pins: 1, 2

## TCC0805COG681J101BT
designator C?  Capacitance: 680pF  (hidden comment: *)
Capacitor, Ceramic (MLCC), 680pF, ±5%, 100V, C0G, ±5%, SMD 0805; Manufacturer: CCTC; Manufacturer Part Number: TCC0805COG681J101BT; Package Size: 0805; JLCPCB Basic Part: No; JLCPCB Part Number: C2932186; Supplier 1: LCSC; Category: Capacitors - MLCC; Supplier Part Number 1: C2932186; Tolerance: ±5%; Voltage Rating: 100V; Temperature Coefficient: C0G; RoHS: Yes; ComponentLink1Description: Datasheet; ComponentLink1URL: https://wmsc.lcsc.com/wmsc/upload/file/pdf/v2/lcsc/2201121530_CCTC-TCC0805COG681J101BT_C2932186.pdf; ComponentLink2Description: JLCPCB Part URL; ComponentLink2URL: https://jlcpcb.com/partdetail/C2932186; ComponentLink3Description: LCSC Part URL; ComponentLink3URL: https://lcsc.com/product-detail/Multilayer-Ceramic-Capacitors-MLCC---SMD-SMT_CCTC-CCTC-TCC0805COG681J101BT_C2932186.html
footprint CAP-0805 (0805 (2012M) Capacitor)
pins: 1, 2

## TCC0805COG681J500BT
designator C?  Capacitance: 680pF  (hidden comment: *)
Capacitor, Ceramic (MLCC), 680pF, ±5%, 50V, C0G, ±5%, SMD 0805; Manufacturer: CCTC; Manufacturer Part Number: TCC0805COG681J500BT; Package Size: 0805; JLCPCB Basic Part: No; JLCPCB Part Number: C376906; Supplier 1: LCSC; Category: Capacitors - MLCC; Supplier Part Number 1: C376906; Tolerance: ±5%; Voltage Rating: 50V; Temperature Coefficient: C0G; RoHS: Yes; ComponentLink1Description: Datasheet; ComponentLink1URL: https://wmsc.lcsc.com/wmsc/upload/file/pdf/v2/lcsc/2304140030_CCTC-TCC0805COG681J500BT_C376906.pdf; ComponentLink2Description: JLCPCB Part URL; ComponentLink2URL: https://jlcpcb.com/partdetail/C376906; ComponentLink3Description: LCSC Part URL; ComponentLink3URL: https://lcsc.com/product-detail/Multilayer-Ceramic-Capacitors-MLCC---SMD-SMT_CCTC-CCTC-TCC0805COG681J500BT_C376906.html
footprint CAP-0805 (0805 (2012M) Capacitor)
pins: 1, 2

## TCC0805COG750J500BT
designator C?  Capacitance: 75pF  (hidden comment: *)
Capacitor, Ceramic (MLCC), 75pF, ±5%, null, C0G, ±5%, SMD 0805; Manufacturer: CCTC; Manufacturer Part Number: TCC0805COG750J500BT; Package Size: 0805; JLCPCB Basic Part: No; JLCPCB Part Number: C5375865; Supplier 1: LCSC; Category: Capacitors - MLCC; Supplier Part Number 1: C5375865; Tolerance: ±5%; Voltage Rating: null; Temperature Coefficient: C0G; RoHS: Yes; ComponentLink1Description: Datasheet; ComponentLink1URL: https://wmsc.lcsc.com/wmsc/upload/file/pdf/v2/lcsc/2403281709_CCTC-TCC0805COG750J500BT_C5375865.pdf; ComponentLink2Description: JLCPCB Part URL; ComponentLink2URL: https://jlcpcb.com/partdetail/C5375865; ComponentLink3Description: LCSC Part URL; ComponentLink3URL: https://lcsc.com/product-detail/Multilayer-Ceramic-Capacitors-MLCC---SMD-SMT_CCTC-CCTC-TCC0805COG750J500BT_C5375865.html
footprint CAP-0805 (0805 (2012M) Capacitor)
pins: 1, 2

## TCC0805COG820J500BT
designator C?  Capacitance: 82pF  (hidden comment: *)
Capacitor, Ceramic (MLCC), 82pF, ±5%, 50V, C0G, ±5%, SMD 0805; Manufacturer: CCTC; Manufacturer Part Number: TCC0805COG820J500BT; Package Size: 0805; JLCPCB Basic Part: No; JLCPCB Part Number: C282712; Supplier 1: LCSC; Category: Capacitors - MLCC; Supplier Part Number 1: C282712; Tolerance: ±5%; Voltage Rating: 50V; Temperature Coefficient: C0G; RoHS: Yes; ComponentLink1Description: Datasheet; ComponentLink1URL: https://wmsc.lcsc.com/wmsc/upload/file/pdf/v2/lcsc/2304140030_CCTC-TCC0805COG820J500BT_C282712.pdf; ComponentLink2Description: JLCPCB Part URL; ComponentLink2URL: https://jlcpcb.com/partdetail/C282712; ComponentLink3Description: LCSC Part URL; ComponentLink3URL: https://lcsc.com/product-detail/Multilayer-Ceramic-Capacitors-MLCC---SMD-SMT_CCTC-CCTC-TCC0805COG820J500BT_C282712.html
footprint CAP-0805 (0805 (2012M) Capacitor)
pins: 1, 2

## TCC0805COG910J500BT
designator C?  Capacitance: 91pF  (hidden comment: *)
Capacitor, Ceramic (MLCC), 91pF, ±5%, 50V, C0G, ±5%, SMD 0805; Manufacturer: CCTC; Manufacturer Part Number: TCC0805COG910J500BT; Package Size: 0805; JLCPCB Basic Part: No; JLCPCB Part Number: C376913; Supplier 1: LCSC; Category: Capacitors - MLCC; Supplier Part Number 1: C376913; Tolerance: ±5%; Voltage Rating: 50V; Temperature Coefficient: C0G; RoHS: Yes; ComponentLink1Description: Datasheet; ComponentLink1URL: https://wmsc.lcsc.com/wmsc/upload/file/pdf/v2/lcsc/2304140030_CCTC-TCC0805COG910J500BT_C376913.pdf; ComponentLink2Description: JLCPCB Part URL; ComponentLink2URL: https://jlcpcb.com/partdetail/C376913; ComponentLink3Description: LCSC Part URL; ComponentLink3URL: https://lcsc.com/product-detail/Multilayer-Ceramic-Capacitors-MLCC---SMD-SMT_CCTC-CCTC-TCC0805COG910J500BT_C376913.html
footprint CAP-0805 (0805 (2012M) Capacitor)
pins: 1, 2

## TCC0805X5R105M250DT
designator C?  Capacitance: 1uF  (hidden comment: *)
Capacitor, Ceramic (MLCC), 1uF, ±20%, 25V, X5R, ±20%, SMD 0805; Manufacturer: CCTC; Manufacturer Part Number: TCC0805X5R105M250DT; Package Size: 0805; JLCPCB Basic Part: No; JLCPCB Part Number: C7393927; Supplier 1: LCSC; Category: Capacitors - MLCC; Supplier Part Number 1: C7393927; Tolerance: ±20%; Voltage Rating: 25V; Temperature Coefficient: X5R; RoHS: Yes; ComponentLink1Description: Datasheet; ComponentLink1URL: https://wmsc.lcsc.com/wmsc/upload/file/pdf/v2/lcsc/2306211554_CCTC-TCC0805X5R105M250DT_C7393927.pdf; ComponentLink2Description: JLCPCB Part URL; ComponentLink2URL: https://jlcpcb.com/partdetail/C7393927; ComponentLink3Description: LCSC Part URL; ComponentLink3URL: https://lcsc.com/product-detail/Multilayer-Ceramic-Capacitors-MLCC---SMD-SMT_CCTC-CCTC-TCC0805X5R105M250DT_C7393927.html
footprint CAP-0805 (0805 (2012M) Capacitor)
pins: 1, 2

## TCC0805X5R105M250FT
designator C?  Capacitance: 1uF  (hidden comment: *)
Capacitor, Ceramic (MLCC), 1uF, ±20%, 25V, X5R, ±20%, SMD 0805; Manufacturer: CCTC; Manufacturer Part Number: TCC0805X5R105M250FT; Package Size: 0805; JLCPCB Basic Part: No; JLCPCB Part Number: C713511; Supplier 1: LCSC; Category: Capacitors - MLCC; Supplier Part Number 1: C713511; Tolerance: ±20%; Voltage Rating: 25V; Temperature Coefficient: X5R; RoHS: Yes; ComponentLink1Description: Datasheet; ComponentLink1URL: https://wmsc.lcsc.com/wmsc/upload/file/pdf/v2/lcsc/2304140030_CCTC-TCC0805X5R105M250FT_C713511.pdf; ComponentLink2Description: JLCPCB Part URL; ComponentLink2URL: https://jlcpcb.com/partdetail/C713511; ComponentLink3Description: LCSC Part URL; ComponentLink3URL: https://lcsc.com/product-detail/Multilayer-Ceramic-Capacitors-MLCC---SMD-SMT_CCTC-CCTC-TCC0805X5R105M250FT_C713511.html
footprint CAP-0805 (0805 (2012M) Capacitor)
pins: 1, 2

## TCC0805X5R106K6R3FT
designator C?  Capacitance: 10uF  (hidden comment: *)
Capacitor, Ceramic (MLCC), 10uF, ±10%, 6.3V, X5R, ±10%, SMD 0805; Manufacturer: CCTC; Manufacturer Part Number: TCC0805X5R106K6R3FT; Package Size: 0805; JLCPCB Basic Part: No; JLCPCB Part Number: C380333; Supplier 1: LCSC; Category: Capacitors - MLCC; Supplier Part Number 1: C380333; Tolerance: ±10%; Voltage Rating: 6.3V; Temperature Coefficient: X5R; RoHS: Yes; ComponentLink1Description: Datasheet; ComponentLink1URL: https://wmsc.lcsc.com/wmsc/upload/file/pdf/v2/lcsc/2304140030_CCTC-TCC0805X5R106K6R3FT_C380333.pdf; ComponentLink2Description: JLCPCB Part URL; ComponentLink2URL: https://jlcpcb.com/partdetail/C380333; ComponentLink3Description: LCSC Part URL; ComponentLink3URL: https://lcsc.com/product-detail/Multilayer-Ceramic-Capacitors-MLCC---SMD-SMT_CCTC-CCTC-TCC0805X5R106K6R3FT_C380333.html
footprint CAP-0805 (0805 (2012M) Capacitor)
pins: 1, 2

## TCC0805X5R106K100FT
designator C?  Capacitance: 10uF  (hidden comment: *)
Capacitor, Ceramic (MLCC), 10uF, ±10%, 10V, X5R, ±10%, SMD 0805; Manufacturer: CCTC; Manufacturer Part Number: TCC0805X5R106K100FT; Package Size: 0805; JLCPCB Basic Part: No; JLCPCB Part Number: C380331; Supplier 1: LCSC; Category: Capacitors - MLCC; Supplier Part Number 1: C380331; Tolerance: ±10%; Voltage Rating: 10V; Temperature Coefficient: X5R; RoHS: Yes; ComponentLink1Description: Datasheet; ComponentLink1URL: https://wmsc.lcsc.com/wmsc/upload/file/pdf/v2/lcsc/2304140030_CCTC-TCC0805X5R106K100FT_C380331.pdf; ComponentLink2Description: JLCPCB Part URL; ComponentLink2URL: https://jlcpcb.com/partdetail/C380331; ComponentLink3Description: LCSC Part URL; ComponentLink3URL: https://lcsc.com/product-detail/Multilayer-Ceramic-Capacitors-MLCC---SMD-SMT_CCTC-CCTC-TCC0805X5R106K100FT_C380331.html
footprint CAP-0805 (0805 (2012M) Capacitor)
pins: 1, 2

## TCC0805X5R106K160FT
designator C?  Capacitance: 10uF  (hidden comment: *)
Capacitor, Ceramic (MLCC), 10uF, ±10%, 16V, X5R, ±10%, SMD 0805; Manufacturer: CCTC; Manufacturer Part Number: TCC0805X5R106K160FT; Package Size: 0805; JLCPCB Basic Part: No; JLCPCB Part Number: C380332; Supplier 1: LCSC; Category: Capacitors - MLCC; Supplier Part Number 1: C380332; Tolerance: ±10%; Voltage Rating: 16V; Temperature Coefficient: X5R; RoHS: Yes; ComponentLink1Description: Datasheet; ComponentLink1URL: https://wmsc.lcsc.com/wmsc/upload/file/pdf/v2/lcsc/2304140030_CCTC-TCC0805X5R106K160FT_C380332.pdf; ComponentLink2Description: JLCPCB Part URL; ComponentLink2URL: https://jlcpcb.com/partdetail/C380332; ComponentLink3Description: LCSC Part URL; ComponentLink3URL: https://lcsc.com/product-detail/Multilayer-Ceramic-Capacitors-MLCC---SMD-SMT_CCTC-CCTC-TCC0805X5R106K160FT_C380332.html
footprint CAP-0805 (0805 (2012M) Capacitor)
pins: 1, 2

## TCC0805X5R106M160FT
designator C?  Capacitance: 10000000pF  (hidden comment: *)
Capacitor, Ceramic (MLCC), 10000000pF, ±20%, 16V, X5R, ±20%, SMD 0805; Manufacturer: CCTC; Manufacturer Part Number: TCC0805X5R106M160FT; Package Size: 0805; JLCPCB Basic Part: No; JLCPCB Part Number: C880609; Supplier 1: LCSC; Category: Capacitors - MLCC; Supplier Part Number 1: C880609; Tolerance: ±20%; Voltage Rating: 16V; Temperature Coefficient: X5R; RoHS: Yes; ComponentLink1Description: Datasheet; ComponentLink1URL: https://wmsc.lcsc.com/wmsc/upload/file/pdf/v2/lcsc/2304140030_CCTC-TCC0805X5R106M160FT_C880609.pdf; ComponentLink2Description: JLCPCB Part URL; ComponentLink2URL: https://jlcpcb.com/partdetail/C880609; ComponentLink3Description: LCSC Part URL; ComponentLink3URL: https://lcsc.com/product-detail/Multilayer-Ceramic-Capacitors-MLCC---SMD-SMT_CCTC-CCTC-TCC0805X5R106M160FT_C880609.html
footprint CAP-0805 (0805 (2012M) Capacitor)
pins: 1, 2

## TCC0805X5R225K100FT
designator C?  Capacitance: 2.2uF  (hidden comment: *)
Capacitor, Ceramic (MLCC), 2.2uF, ±10%, 10V, X5R, ±10%, SMD 0805; Manufacturer: CCTC; Manufacturer Part Number: TCC0805X5R225K100FT; Package Size: 0805; JLCPCB Basic Part: No; JLCPCB Part Number: C380334; Supplier 1: LCSC; Category: Capacitors - MLCC; Supplier Part Number 1: C380334; Tolerance: ±10%; Voltage Rating: 10V; Temperature Coefficient: X5R; RoHS: Yes; ComponentLink1Description: Datasheet; ComponentLink1URL: https://wmsc.lcsc.com/wmsc/upload/file/pdf/v2/lcsc/2304140030_CCTC-TCC0805X5R225K100FT_C380334.pdf; ComponentLink2Description: JLCPCB Part URL; ComponentLink2URL: https://jlcpcb.com/partdetail/C380334; ComponentLink3Description: LCSC Part URL; ComponentLink3URL: https://lcsc.com/product-detail/Multilayer-Ceramic-Capacitors-MLCC---SMD-SMT_CCTC-CCTC-TCC0805X5R225K100FT_C380334.html
footprint CAP-0805 (0805 (2012M) Capacitor)
pins: 1, 2

## TCC0805X5R225K160FT
designator C?  Capacitance: 2.2uF  (hidden comment: *)
Capacitor, Ceramic (MLCC), 2.2uF, ±10%, 16V, X5R, ±10%, SMD 0805; Manufacturer: CCTC; Manufacturer Part Number: TCC0805X5R225K160FT; Package Size: 0805; JLCPCB Basic Part: No; JLCPCB Part Number: C380335; Supplier 1: LCSC; Category: Capacitors - MLCC; Supplier Part Number 1: C380335; Tolerance: ±10%; Voltage Rating: 16V; Temperature Coefficient: X5R; RoHS: Yes; ComponentLink1Description: Datasheet; ComponentLink1URL: https://wmsc.lcsc.com/wmsc/upload/file/pdf/v2/lcsc/2304140030_CCTC-TCC0805X5R225K160FT_C380335.pdf; ComponentLink2Description: JLCPCB Part URL; ComponentLink2URL: https://jlcpcb.com/partdetail/C380335; ComponentLink3Description: LCSC Part URL; ComponentLink3URL: https://lcsc.com/product-detail/Multilayer-Ceramic-Capacitors-MLCC---SMD-SMT_CCTC-CCTC-TCC0805X5R225K160FT_C380335.html
footprint CAP-0805 (0805 (2012M) Capacitor)
pins: 1, 2

## TCC0805X5R225K250FT
designator C?  Capacitance: 2.2uF  (hidden comment: *)
Capacitor, Ceramic (MLCC), 2.2uF, ±10%, 25V, X5R, ±10%, SMD 0805; Manufacturer: CCTC; Manufacturer Part Number: TCC0805X5R225K250FT; Package Size: 0805; JLCPCB Basic Part: No; JLCPCB Part Number: C2903666; Supplier 1: LCSC; Category: Capacitors - MLCC; Supplier Part Number 1: C2903666; Tolerance: ±10%; Voltage Rating: 25V; Temperature Coefficient: X5R; RoHS: Yes; ComponentLink1Description: Datasheet; ComponentLink1URL: https://wmsc.lcsc.com/wmsc/upload/file/pdf/v2/lcsc/2110101130_CCTC-TCC0805X5R225K250FT_C2903666.pdf; ComponentLink2Description: JLCPCB Part URL; ComponentLink2URL: https://jlcpcb.com/partdetail/C2903666; ComponentLink3Description: LCSC Part URL; ComponentLink3URL: https://lcsc.com/product-detail/Multilayer-Ceramic-Capacitors-MLCC---SMD-SMT_CCTC-CCTC-TCC0805X5R225K250FT_C2903666.html
footprint CAP-0805 (0805 (2012M) Capacitor)
pins: 1, 2

## TCC0805X5R225K500FT
designator C?  Capacitance: 2.2uF  (hidden comment: *)
Capacitor, Ceramic (MLCC), 2.2uF, ±10%, 50V, X5R, ±10%, SMD 0805; Manufacturer: CCTC; Manufacturer Part Number: TCC0805X5R225K500FT; Package Size: 0805; JLCPCB Basic Part: No; JLCPCB Part Number: C2903667; Supplier 1: LCSC; Category: Capacitors - MLCC; Supplier Part Number 1: C2903667; Tolerance: ±10%; Voltage Rating: 50V; Temperature Coefficient: X5R; RoHS: Yes; ComponentLink1Description: Datasheet; ComponentLink1URL: https://wmsc.lcsc.com/wmsc/upload/file/pdf/v2/lcsc/2110101130_CCTC-TCC0805X5R225K500FT_C2903667.pdf; ComponentLink2Description: JLCPCB Part URL; ComponentLink2URL: https://jlcpcb.com/partdetail/C2903667; ComponentLink3Description: LCSC Part URL; ComponentLink3URL: https://lcsc.com/product-detail/Multilayer-Ceramic-Capacitors-MLCC---SMD-SMT_CCTC-CCTC-TCC0805X5R225K500FT_C2903667.html
footprint CAP-0805 (0805 (2012M) Capacitor)
pins: 1, 2

## TCC0805X5R225M250FT
designator C?  Capacitance: 2.2uF  (hidden comment: *)
Capacitor, Ceramic (MLCC), 2.2uF, ±20%, 25V, X5R, ±20%, SMD 0805; Manufacturer: CCTC; Manufacturer Part Number: TCC0805X5R225M250FT; Package Size: 0805; JLCPCB Basic Part: No; JLCPCB Part Number: C696841; Supplier 1: LCSC; Category: Capacitors - MLCC; Supplier Part Number 1: C696841; Tolerance: ±20%; Voltage Rating: 25V; Temperature Coefficient: X5R; RoHS: Yes; ComponentLink1Description: Datasheet; ComponentLink1URL: https://wmsc.lcsc.com/wmsc/upload/file/pdf/v2/lcsc/2304140030_CCTC-TCC0805X5R225M250FT_C696841.pdf; ComponentLink2Description: JLCPCB Part URL; ComponentLink2URL: https://jlcpcb.com/partdetail/C696841; ComponentLink3Description: LCSC Part URL; ComponentLink3URL: https://lcsc.com/product-detail/Multilayer-Ceramic-Capacitors-MLCC---SMD-SMT_CCTC-CCTC-TCC0805X5R225M250FT_C696841.html
footprint CAP-0805 (0805 (2012M) Capacitor)
pins: 1, 2

## TCC0805X5R226K100FT
designator C?  Capacitance: 22uF  (hidden comment: *)
Capacitor, Ceramic (MLCC), 22uF, ±10%, 10V, X5R, ±10%, SMD 0805; Manufacturer: CCTC; Manufacturer Part Number: TCC0805X5R226K100FT; Package Size: 0805; JLCPCB Basic Part: No; JLCPCB Part Number: C380336; Supplier 1: LCSC; Category: Capacitors - MLCC; Supplier Part Number 1: C380336; Tolerance: ±10%; Voltage Rating: 10V; Temperature Coefficient: X5R; RoHS: Yes; ComponentLink1Description: Datasheet; ComponentLink1URL: https://wmsc.lcsc.com/wmsc/upload/file/pdf/v2/lcsc/2304140030_CCTC-TCC0805X5R226K100FT_C380336.pdf; ComponentLink2Description: JLCPCB Part URL; ComponentLink2URL: https://jlcpcb.com/partdetail/C380336; ComponentLink3Description: LCSC Part URL; ComponentLink3URL: https://lcsc.com/product-detail/Multilayer-Ceramic-Capacitors-MLCC---SMD-SMT_CCTC-CCTC-TCC0805X5R226K100FT_C380336.html
footprint CAP-0805 (0805 (2012M) Capacitor)
pins: 1, 2

## TCC0805X5R226M6R3FT
designator C?  Capacitance: 22uF  (hidden comment: *)
Capacitor, Ceramic (MLCC), 22uF, ±20%, 6.3V, X5R, ±20%, SMD 0805; Manufacturer: CCTC; Manufacturer Part Number: TCC0805X5R226M6R3FT; Package Size: 0805; JLCPCB Basic Part: No; JLCPCB Part Number: C380340; Supplier 1: LCSC; Category: Capacitors - MLCC; Supplier Part Number 1: C380340; Tolerance: ±20%; Voltage Rating: 6.3V; Temperature Coefficient: X5R; RoHS: Yes; ComponentLink1Description: Datasheet; ComponentLink1URL: https://wmsc.lcsc.com/wmsc/upload/file/pdf/v2/lcsc/2304140030_CCTC-TCC0805X5R226M6R3FT_C380340.pdf; ComponentLink2Description: JLCPCB Part URL; ComponentLink2URL: https://jlcpcb.com/partdetail/C380340; ComponentLink3Description: LCSC Part URL; ComponentLink3URL: https://lcsc.com/product-detail/Multilayer-Ceramic-Capacitors-MLCC---SMD-SMT_CCTC-CCTC-TCC0805X5R226M6R3FT_C380340.html
footprint CAP-0805 (0805 (2012M) Capacitor)
pins: 1, 2

## TCC0805X5R226M100FT
designator C?  Capacitance: 22uF  (hidden comment: *)
Capacitor, Ceramic (MLCC), 22uF, ±20%, 10V, X5R, ±20%, SMD 0805; Manufacturer: CCTC; Manufacturer Part Number: TCC0805X5R226M100FT; Package Size: 0805; JLCPCB Basic Part: No; JLCPCB Part Number: C380338; Supplier 1: LCSC; Category: Capacitors - MLCC; Supplier Part Number 1: C380338; Tolerance: ±20%; Voltage Rating: 10V; Temperature Coefficient: X5R; RoHS: Yes; ComponentLink1Description: Datasheet; ComponentLink1URL: https://wmsc.lcsc.com/wmsc/upload/file/pdf/v2/lcsc/2304140030_CCTC-TCC0805X5R226M100FT_C380338.pdf; ComponentLink2Description: JLCPCB Part URL; ComponentLink2URL: https://jlcpcb.com/partdetail/C380338; ComponentLink3Description: LCSC Part URL; ComponentLink3URL: https://lcsc.com/product-detail/Multilayer-Ceramic-Capacitors-MLCC---SMD-SMT_CCTC-CCTC-TCC0805X5R226M100FT_C380338.html
footprint CAP-0805 (0805 (2012M) Capacitor)
pins: 1, 2
